# Altium footprint library 元件2.PcbLib: 204 footprints (part 9 of 13)
Each footprint in its own frame and in the unit in brackets; x right, y up, seen from the top. Pads: shape width x height; smd on the part's side, far side on the other; paste and mask are expansions set on the pad; w line width, h text height; cw(c..) or ccw(c..) is an arc to the next point about the centre after c.
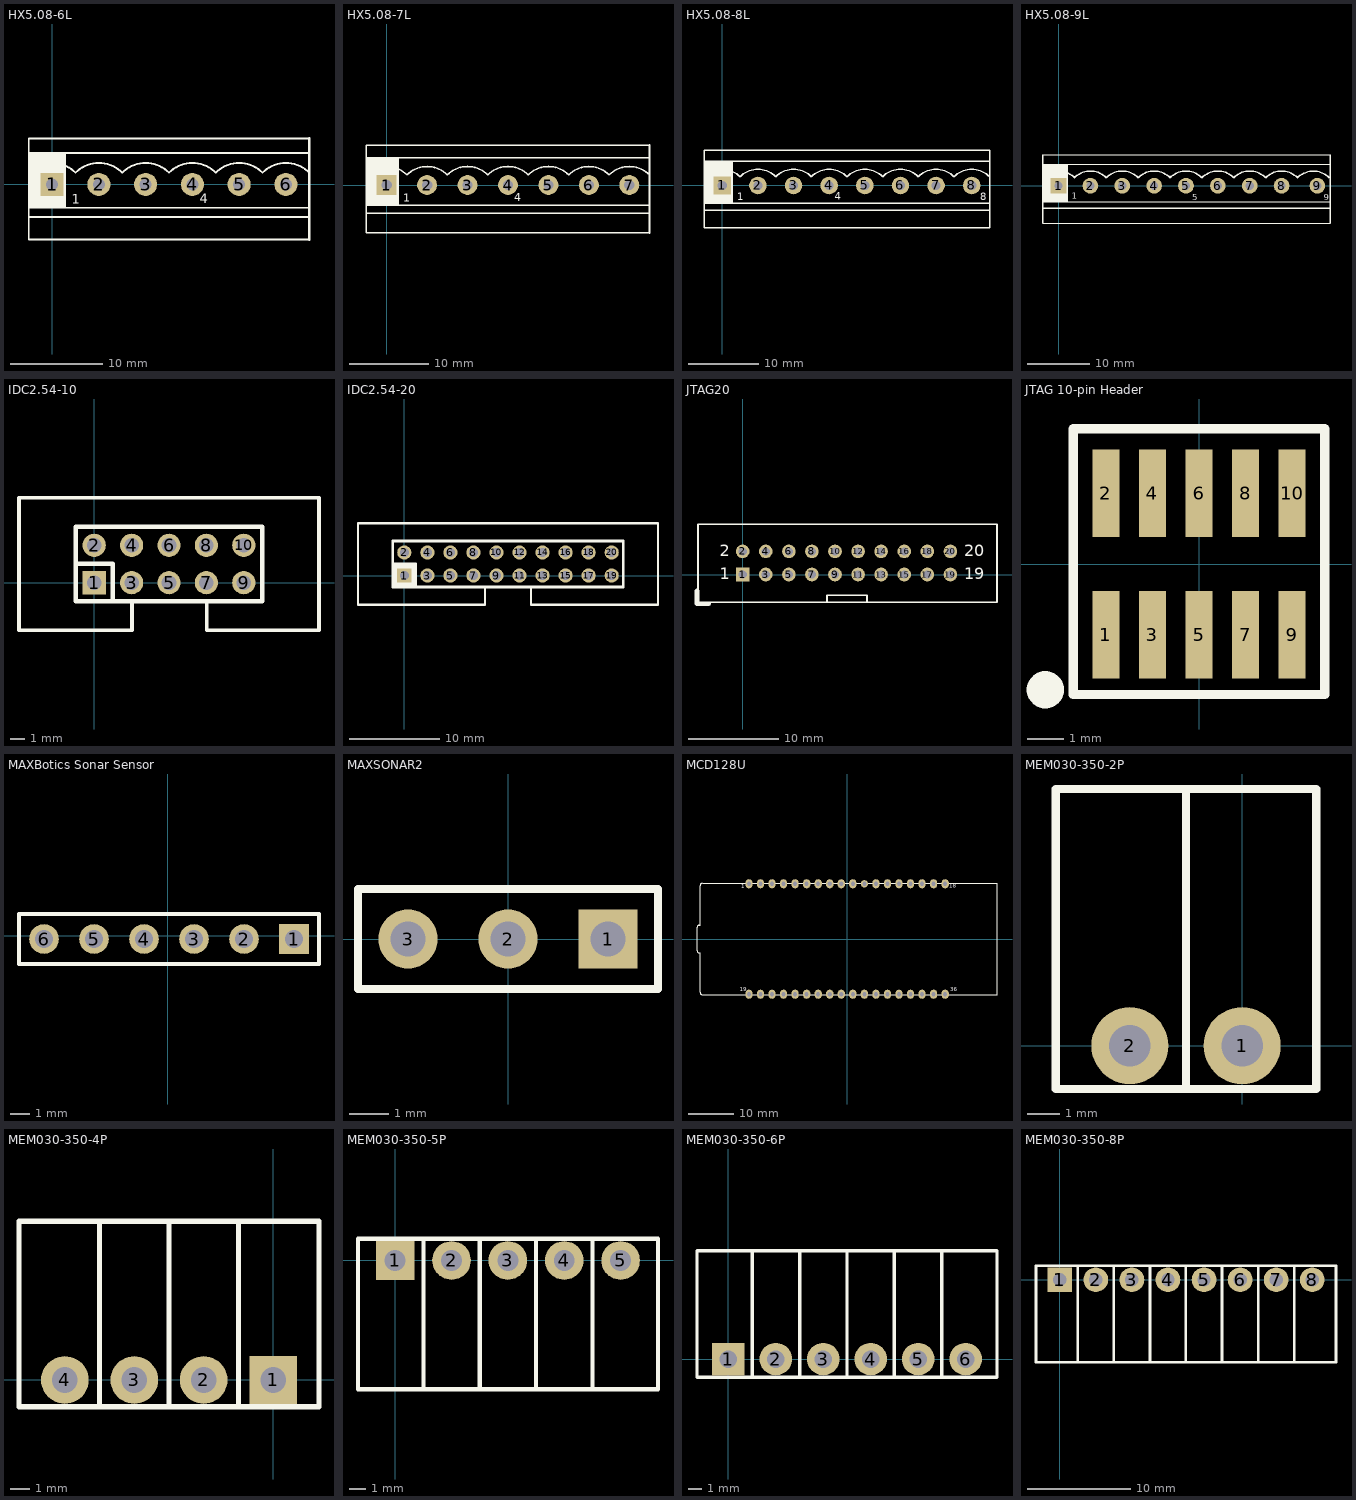
[diagram p8: the footprints below, top view; thin cyan lines are the x and y axes]

## HX5.08-6L [mm]
pads (6):
  rect 2.5x2.5 hole 1.3: 1(0,0)
  round 2.5 hole 1.3: 2(5.08,0) 3(10.16,0) 4(15.24,0) 5(20.32,0) 6(25.4,0)
Top Overlay:
  rectangle: -2.54,-2.54 1.524,3.429
  lines w0.203: -2.544,1.274 cw(c0,-1.27) 2.544,1.274 ; -2.54,-3.556 27.94,-3.556 ; -2.54,-2.54 27.94,-2.54 ; -2.54,3.429 27.94,3.429 ; 2.536,1.274 cw(c5.08,-1.27) 7.624,1.274 ; 7.616,1.274 cw(c10.16,-1.27) 12.704,1.274 ; 12.696,1.274 cw(c15.24,-1.27) 17.784,1.274 ; 17.776,1.274 cw(c20.32,-1.27) 22.864,1.274 ; 22.856,1.274 cw(c25.4,-1.27) 27.944,1.274 ; 27.94,-6 -2.54,-6 -2.54,5 27.94,5
  lines w0.254: 27.94,-6 27.94,5
  text "1" at 2.108,-2.108 h1.02
  text "4" at 16.053,-2.032 h1.02
3D body "050-6.step": height 11, standoff -2, extent -2.5,-5.5 27.5,2.5

## HX5.08-7L [mm]
pads (7):
  rect 2.5x2.5 hole 1.3: 1(0,0)
  round 2.5 hole 1.3: 2(5.08,0) 3(10.16,0) 4(15.24,0) 5(20.32,0) 6(25.4,0) 7(30.48,0)
Top Overlay:
  rectangle: -2.54,-2.54 1.524,3.429
  lines w0.203: -2.544,1.274 cw(c0,-1.27) 2.544,1.274 ; -2.54,-3.556 33.02,-3.556 ; -2.54,-2.54 33.02,-2.54 ; -2.54,3.429 33.02,3.429 ; 2.536,1.274 cw(c5.08,-1.27) 7.624,1.274 ; 7.616,1.274 cw(c10.16,-1.27) 12.704,1.274 ; 12.696,1.274 cw(c15.24,-1.27) 17.784,1.274 ; 17.776,1.274 cw(c20.32,-1.27) 22.864,1.274 ; 22.856,1.274 cw(c25.4,-1.27) 27.944,1.274 ; 27.936,1.274 cw(c30.48,-1.27) 33.024,1.274 ; 33.02,-6 -2.54,-6 -2.54,5 33.02,5
  lines w0.254: 33.02,-6 33.02,5
  text "4" at 16.053,-2.032 h1.02
  text "1" at 2.108,-2.108 h1.02
3D body "050-7.step": height 11, standoff -2, extent -2.5,-5.5 32.5,2.5

## HX5.08-8L [mm]
pads (8):
  rect 2.5x2.5 hole 1.3: 1(0,0)
  round 2.5 hole 1.3: 2(5.08,0) 3(10.16,0) 4(15.24,0) 5(20.32,0) 6(25.4,0) 7(30.48,0) 8(35.56,0)
Top Overlay:
  rectangle: -2.54,-2.54 1.524,3.429
  lines w0.203: -2.544,1.274 cw(c0,-1.27) 2.544,1.274 ; -2.54,-3.556 38.1,-3.556 ; -2.54,-2.54 38.1,-2.54 ; -2.54,3.429 38.1,3.429 ; 2.536,1.274 cw(c5.08,-1.27) 7.624,1.274 ; 7.616,1.274 cw(c10.16,-1.27) 12.704,1.274 ; 12.696,1.274 cw(c15.24,-1.27) 17.784,1.274 ; 17.776,1.274 cw(c20.32,-1.27) 22.864,1.274 ; 22.856,1.274 cw(c25.4,-1.27) 27.944,1.274 ; 27.936,1.274 cw(c30.48,-1.27) 33.024,1.274 ; 33.016,1.274 cw(c35.56,-1.27) 38.104,1.274 ; -2.54,-6 38.1,-6 38.1,5 -2.54,5 -2.54,-6
  text "8" at 36.779,-2.083 h1.02
  text "4" at 16.053,-2.032 h1.02
  text "1" at 2.108,-2.108 h1.02
3D body "050-8.step": height 11, standoff -2, extent -2.5,-5.5 37.5,2.5

## HX5.08-9L [mm]
pads (9):
  rect 2.5x2.5 hole 1.3: 1(0,0)
  round 2.5 hole 1.3: 2(5.08,0) 3(10.16,0) 4(15.24,0) 5(20.32,0) 6(25.4,0) 7(30.48,0) 8(35.56,0) 9(41.275,0)
Top Overlay:
  rectangle: -2.54,-2.54 1.524,3.429
  lines w0.154: -2.54,-6 43.276,-6 43.307,-5.969 ; -2.54,-2.54 43.307,-2.54 ; -2.54,3.429 43.307,3.429 ; -2.54,4.953 43.307,4.953
  lines w0.203: -2.544,1.274 cw(c0,-1.27) 2.544,1.274 ; -2.54,-6 -2.54,4.953 ; -2.54,-3.556 43.307,-3.556 ; 2.536,1.274 cw(c5.08,-1.27) 7.624,1.274 ; 7.616,1.274 cw(c10.16,-1.27) 12.704,1.274 ; 12.696,1.274 cw(c15.24,-1.27) 17.784,1.274 ; 17.776,1.274 cw(c20.32,-1.27) 22.864,1.274 ; 22.856,1.274 cw(c25.4,-1.27) 27.944,1.274 ; 27.936,1.274 cw(c30.48,-1.27) 33.024,1.274 ; 33.016,1.274 cw(c35.56,-1.27) 38.104,1.274 ; 38.1,1.27 cw(c40.644,-1.274) 43.189,1.27 ; 43.307,-5.969 43.307,4.953
  text "5" at 21.336,-2.286 h1.02
  text "1" at 2.108,-2.108 h1.02
  text "9" at 42.291,-2.286 h1.02
3D body "050-9.STEP": height 11, standoff -2, extent -2.5,-5.5 42.5,2.5

## IDC2.54-10 [mil]
pads (10):
  rect 62x62 hole 39.37: 1(0,0)
  round 62 hole 39.37: 2(0,100) 3(100,0) 4(100,100) 5(200,0) 6(200,100) 7(300,0) 8(300,100) 9(400,0) 10(400,100)
Top Overlay:
  lines w10: 101,-50 101,-127.17 -201.18,-127.17 -201.18,227.16 601.18,227.16 ; 301,-50 301,-127.17 601.18,-127.17 ; 601,-127.33 601,227
  lines w12: -50,50 50,50 50,-50 ; -50,-50 450,-50 450,150 -50,150 -50,-50
3D body "SW3dPS-HDB-10.STEP": height 366.14, standoff -98.43, extent -196.64,-128.08 598.64,242

## IDC2.54-20 [mil]
pads (20):
  rect 62x62 hole 39.37: 1(0,0)
  round 62 hole 39.37: 2(0,100) 3(100,0) 4(100,100) 5(200,0) 6(200,100) 7(300,0) 8(300,100) 9(400,0) 10(400,100) 11(500,0) 12(500,100) 13(600,0) 14(600,100) 15(700,0) 16(700,100) 17(800,0) 18(800,100) 19(900,0) 20(900,100)
Top Overlay:
  rectangle: -50,-50 49,52
  lines w10: 350,-50 350,-127.17 -201.18,-127.17 -201.18,227.16 1101.18,227.16 1101.18,-127.17 550,-127.17 550,-50
  lines w12: -50,50 50,50 50,-50 ; -50,-50 950,-50 950,150 -50,150 -50,-50
3D body "SW3dPS-BH-20.STEP": height 352.36, standoff -114.17, extent -201,-123.27 1099,235

## JTAG20 [mm]
pads (20):
  rect 1.5x1.5 hole 0.9: 1(0,0)
  round 1.5 hole 0.9: 2(0,2.54) 3(2.54,0) 4(2.54,2.54) 5(5.08,0) 6(5.08,2.54) 7(7.62,0) 8(7.62,2.54) 9(10.16,0) 10(10.16,2.54) 11(12.7,0) 12(12.7,2.54) 13(15.24,0) 14(15.24,2.54) 15(17.78,0) 16(17.78,2.54) 17(20.32,0) 18(20.32,2.54) 19(22.86,0) 20(22.86,2.54)
Top Overlay:
  lines w0.2: 9.271,-3.023 9.271,-2.286 13.691,-2.286 13.691,-3.048 ; -4.902,-3.048 -4.902,5.537 27.991,5.537 27.991,-3.048 -4.902,-3.048
  lines w0.5: -5.029,-1.803 -5.029,-3.226 -3.734,-3.226
  text "20" at 24.384,2.032 h1.27
  text "19" at 24.384,-0.508 h1.27
  text "1" at -2.54,-0.508 h1.27
  text "2" at -2.54,2.032 h1.27
3D body "SW3dPS-PinBox Connector_20Pin.STEP": height 10.9, standoff -3, extent -5.009,-3.181 27.991,5.619

## JTAG 10-pin Header [mil] "Jtag port SMT"
pads (10):
  rect 29x94 smd: 1(-100,-76) 2(-100,76) 3(-50,-76) 4(-50,76) 5(0,-76) 6(0,76) 7(50,-76) 8(50,76) 9(100,-76) 10(100,76)
Top Overlay:
  circle w20: c-165,-135 r10
  lines w10: -135,-140 135,-140 135,145 -135,145 -135,-140
3D body "Harwin_M52-040000S0545_HDRV10W46P254X127_2X5_635X720X777.STEP": height 303.15, standoff -2.76, extent -124.8,-142.91 125.2,140.55

## MAXBotics Sonar Sensor [mm] "Sonar Sensor Footprint (w/o temp sensor)"
pads (6):
  rect 1.5x1.5 hole 0.9: 1(6.406,-0.158)
  round 1.5 hole 0.9: 2(3.866,-0.158) 3(1.326,-0.158) 4(-1.214,-0.158) 5(-3.754,-0.158) 6(-6.294,-0.158)
Top Overlay:
  lines w0.2: -7.564,-1.428 -7.564,1.112 7.676,1.112 7.676,-1.428 -7.564,-1.428
3D body "6_pin_sonar.stp": height 3.06, standoff -11.16, extent -7.383,-1.36 7.603,0.977
3D body "HRLV-MaxSonar-EZ.stp": height -6, standoff -21.42, extent -10.349,-18.639 11.749,1.3

## MAXSONAR2 [mm]
pads (3):
  rect 1.5x1.5 hole 0.9: 1(2.54,0)
  round 1.5 hole 0.9: 2(0,0) 3(-2.54,0)
Top Overlay:
  lines w0.2: -3.81,-1.27 3.81,-1.27 3.81,1.27 -3.81,1.27 -3.81,-1.27
3D body "HRLV-MaxSonar-EZ.stp": height 19.94, standoff 0, extent -14.298,-22.318 7.8,-6.9
3D body "User Library-Header_Male_RA_Low_3Pin.STEP": height 2.51, standoff -3, extent -3.81,-9.73 3.81,0.4

## MCD128U [mm]
pads (36):
  oval 1.6x2 hole 0.9: 1(-21.59,12.15) 2(-19.05,12.15) 3(-16.51,12.15) 4(-13.97,12.15) 5(-11.43,12.15) 6(-8.89,12.15) 7(-6.35,12.15) 8(-3.81,12.15) 9(-1.27,12.15) 10(1.27,12.15) 12(6.35,12.15) 13(8.89,12.15) 14(11.43,12.15) 15(13.97,12.15) 16(16.51,12.15) 17(19.05,12.15) 18(21.59,12.15) 19(-21.59,-12.15) 20(-19.05,-12.15) 21(-16.51,-12.15) 22(-13.97,-12.15) 23(-11.43,-12.15) 24(-8.89,-12.15) 25(-6.35,-12.15) 26(-3.81,-12.15) 27(-1.27,-12.15) 28(1.27,-12.15) 29(3.81,-12.15) 30(6.35,-12.15) 31(8.89,-12.15) 32(11.43,-12.15) 33(13.97,-12.15) 34(16.51,-12.15) 35(19.05,-12.15) 36(21.59,-12.15)
  round 1.6 hole 0.9: 11(3.81,12.15)
Top Overlay:
  lines w0.254: -31.85,-12.25 cw(c-31.85,-11.75) -32.35,-11.75 -32.35,-3 -32.639,-3 cw(c-32.639,-2.619) -33.02,-2.619 -33.02,2.54 cw(c-32.56,2.54) -32.56,3 -32.35,3 -32.35,11.75 cw(c-31.85,11.75) -31.85,12.25 ; -31.75,-12.25 33,-12.25 33,12.25 -31.75,12.25
  text "19" at -23.622,-11.811 h1.52
  text "36" at 22.733,-11.811 h1.52
  text "18" at 22.479,10.922 h1.52
  text "1" at -23.241,10.795 h1.52
3D body "MC128U2-3D.STEP": height 6.69, standoff -2.4, extent -33.49,-12.383 33.615,12.253

## MEM030-350-2P [mm]
height 1.75
pads (2):
  round 2.4 hole 1.3: 1(0,0) 2(-3.5,0)
Top Overlay:
  lines w0.254: -1.75,-1.35 -1.75,8 ; -5.811,-1.35 -5.811,8 2.311,8 2.311,-1.35 -5.811,-1.35
3D body "CTB93HD_2.step": height 7.25, standoff -3.4, extent -5.962,-1.247 2.438,7.953

## MEM030-350-4P [mm]
height 2.38
pads (4):
  rect 2.4x2.4 hole 1.3: 1(0,0)
  round 2.4 hole 1.3: 2(-3.5,0) 3(-7,0) 4(-10.5,0)
Top Overlay:
  lines w0.254: -8.75,-1.35 -8.75,8 ; -5.25,-1.35 -5.25,8 ; -1.75,-1.35 -1.75,8 ; -12.811,-1.35 2.311,-1.35 2.311,8 -12.811,8 -12.811,-1.35
3D body "CTB93HD_2.step": height 7.25, standoff -3.4, extent -5.962,-1.247 2.438,7.953
3D body "CTB93HD_2.step": height 7.25, standoff -3.4, extent -12.962,-1.247 -4.562,7.953

## MEM030-350-5P [mm]
pads (5):
  rect 2.4x2.4 hole 1.3: 1(0,0)
  round 2.4 hole 1.3: 2(3.5,0) 3(7,0) 4(10.5,0) 5(14,0)
Top Overlay:
  lines w0.254: 1.75,-8 1.75,1.35 ; 5.25,-8 5.25,1.35 ; 8.75,-8 8.75,1.35 ; 16.311,-8 12.243,-8 ; 16.311,1.35 12.243,1.35 ; 16.324,-8 16.324,1.35 ; 12.243,-8 12.243,1.35 ; 12.243,-8 -2.311,-8 -2.311,1.35 12.243,1.35
3D body "CTB93HD_2.step": height 7.25, standoff -3.4, extent -2.438,-7.953 5.962,1.247
3D body "CTB93HD_3.step": height 7.25, standoff -3.4, extent 4.515,-7.953 16.415,1.247

## MEM030-350-6P [mm]
pads (6):
  rect 2.4x2.4 hole 1.3: 1(0,0)
  round 2.4 hole 1.3: 2(3.5,0) 3(7,0) 4(10.5,0) 5(14,0) 6(17.5,0)
Top Overlay:
  lines w0.254: 1.75,-1.35 1.75,8 ; 5.25,-1.35 5.25,8 ; 8.75,-1.35 8.75,8 ; 15.75,-1.35 15.75,8 ; 12.243,-1.35 19.811,-1.35 19.811,8 12.243,8 ; 12.243,-1.35 -2.311,-1.35 -2.311,8 12.243,8 ; 12.243,-1.35 12.243,8
3D body "CTB93HD_3.step": height 7.25, standoff -3.4, extent -2.415,-1.247 9.485,7.953
3D body "CTB93HD_3.step": height 7.25, standoff -3.4, extent 8.085,-1.247 19.985,7.953

## MEM030-350-8P [mm]
pads (8):
  rect 2.4x2.4 hole 1.3: 1(0,0)
  round 2.4 hole 1.3: 2(3.5,0) 3(7,0) 4(10.5,0) 5(14,0) 6(17.5,0) 7(21,0) 8(24.5,0)
Top Overlay:
  lines w0.254: 1.75,-8 1.75,1.35 ; 5.25,-8 5.25,1.35 ; 8.75,-8 8.75,1.35 ; 15.75,-8 15.75,1.35 ; 19.25,-8 19.25,1.35 ; 22.75,-8 22.75,1.35 ; 12.243,-8 26.811,-8 26.811,1.35 12.243,1.35 ; 12.243,-8 -2.311,-8 -2.311,1.35 12.243,1.35 ; 12.243,-8 12.243,1.35
3D body "CTB93HD_2.step": height 7.25, standoff -3.4, extent 8.062,-7.953 16.462,1.247
3D body "CTB93HD_3.step": height 7.25, standoff -3.4, extent 15.015,-7.953 26.915,1.247
3D body "CTB93HD_3.step": height 7.25, standoff -3.4, extent -2.485,-7.953 9.415,1.247